# Altium integrated library BYTECH_HW_LIB_2019.IntLib: 907 symbols (part 4 of 6) (continued)
## RC0603FR0747KL (continued)
RES SMD 47K OHM 1% 1/10W 0603; MPN: RC0603FR0747KL; CompanyID: VT-00322; Solder: SMT; Value: 47K; Category: RESISTOR
footprint RESC-0603 (1608) (Resistor, Chip; 1.60 mm L X 0.80 mm W X 0.50 mm H body)
pins: 1, 2

## RC0603FR-070RL
designator R?, comment 0R
RES SMD 0.0OHM JUMPER 1/10W 0603; MPN: RC0603FR-070RL; CompanyID: VT-00901; Solder: SMT; Value: 0R; Category: RESISTOR
footprint RESC-0603 (1608) (Resistor, Chip; 1.60 mm L X 0.80 mm W X 0.50 mm H body)
pins: 1, 2

## RC0603FR-071K2L
designator R?, comment 1K2
RES SMD 1.2K OHM 1% 1/10W 0603; MPN: RC0603FR-071K2L; CompanyID: VT-01075; Solder: SMT; Value: 1K2; Category: RESISTOR
footprint RESC-0603 (1608) (Resistor, Chip; 1.60 mm L X 0.80 mm W X 0.50 mm H body)
pins: 1, 2

## RC0603FR-071K5L
designator R?, comment 1K5
RES SMD 1.5K OHM 1% 1/10W 0603; MPN: RC0603FR-071K5L; CompanyID: VT-01079; Solder: SMT; Value: 1K5; Category: RESISTOR
footprint RESC-0603 (1608) (Resistor, Chip; 1.60 mm L X 0.80 mm W X 0.50 mm H body)
pins: 1, 2

## RC0603FR-071KL
designator R?, comment 1K
RES SMD 1 KOHM 1% 1/10W 0603; MPN: RC0603FR-071KL; CompanyID: VT-00574; Solder: SMT; Value: 1K; Category: RESISTOR
footprint RESC-0603 (1608) (Resistor, Chip; 1.60 mm L X 0.80 mm W X 0.50 mm H body)
pins: 1, 2

## RC0603FR-071M5L
designator R?, comment 1.5M
RES SMD 1.5M OHM 1% 1/10W 0603; MPN: RC0603FR-071M5L; Solder: SMT; Value: 1.5M; Category: RESISTOR
footprint RESC-0603 (1608) (Resistor, Chip; 1.60 mm L X 0.80 mm W X 0.50 mm H body)
pins: 1, 2

## RC0603FR-072K7L
designator R?, comment 2K7
RES SMD 2.7K OHM 1% 1/10W 0603; MPN: RC0603FR-072K7L; MFR: Yageo; Solder: SMT; Value: 2K7; Category: RESISTOR
footprint RESC-0603 (1608) (Resistor, Chip; 1.60 mm L X 0.80 mm W X 0.50 mm H body)
pins: 1, 2

## RC0603FR-072KL
designator R?, comment 2k
RES SMD 2 KOHM 1% 1/10W 0603; MPN: RC0603FR-072KL; CompanyID: VT-00326; Solder: SMT; Value: 2k; Category: RESISTOR
footprint RESC-0603 (1608) (Resistor, Chip; 1.60 mm L X 0.80 mm W X 0.50 mm H body)
pins: 1, 2

## RC0603FR-073K3L
designator R?, comment 3K3
RES SMD 3.3K OHM 1% 1/10W 0603; MPN: RC0603FR-073K3L; Solder: SMT; CompanyID: VT-01099; Value: 3K3; Category: RESISTOR
footprint RESC-0603 (1608) (Resistor, Chip; 1.60 mm L X 0.80 mm W X 0.50 mm H body)
pins: 1, 2

## RC0603FR-073K9L
designator R?, comment 3.9K
RES SMD 3.9K OHM 1% 1/10W 0603; MPN: RC0603FR-073K9L; Solder: SMT; Value: 3.9K; Category: RESISTOR
footprint RESC-0603 (1608) (Resistor, Chip; 1.60 mm L X 0.80 mm W X 0.50 mm H body)
pins: 1, 2

## RC0603FR-074K7L
designator R?, comment 4K7
RES SMD 4.7K OHM 1% 1/10W 0603; MPN: RC0603FR-074K7L; CompanyID: VT-00327; Solder: SMT; Value: 4K7; Category: RESISTOR
footprint RESC-0603 (1608) (Resistor, Chip; 1.60 mm L X 0.80 mm W X 0.50 mm H body)
pins: 1, 2

## RC0603FR-075K6L
designator R?, comment 5K6
RES SMD 5.6K OHM 1% 1/10W 0603; MPN: RC0603FR-075K6L; CompanyID: VT-00869; Solder: SMT; Value: 5K6; Category: RESISTOR
footprint RESC-0603 (1608) (Resistor, Chip; 1.60 mm L X 0.80 mm W X 0.50 mm H body)
pins: 1, 2

## RC0603FR-075M1L
designator R?, comment 5.1M
RES SMD 5.1M OHM 1% 1/10W 0603; MPN: RC0603FR-075M1L; MFR: YAGEO; Solder: SMT; Value: 5.1M; Category: RESISTOR
footprint RESC-0603 (1608) (Resistor, Chip; 1.60 mm L X 0.80 mm W X 0.50 mm H body)
pins: 1, 2

## RC0603FR-075R1L
designator R?, comment 5.1R
RES SMD 5.1 OHM 1% 1/10W 0603; MPN: RC0603FR-075R1L; Solder: SMT; Value: 5.1R; Category: RESISTOR
footprint RESC-0603 (1608) (Resistor, Chip; 1.60 mm L X 0.80 mm W X 0.50 mm H body)
pins: 1, 2

## RC0603FR-076K8L
designator R?, comment 6K8
RES SMD 6.8K OHM 1% 1/10W 0603; MPN: RC0603FR-076K8L; CompanyID: VT-00777; Solder: SMT; Value: 6K8; Category: RESISTOR
footprint RESC-0603 (1608) (Resistor, Chip; 1.60 mm L X 0.80 mm W X 0.50 mm H body)
pins: 1, 2

## RC0603FR-077K5L
designator R?, comment 7.5K
RES SMD 7.5K OHM 1% 1/10W 0603; MPN: RC0603FR-077K5L; Solder: SMT; CompanyID: VT-01025; Value: 7.5K; Category: RESISTOR
footprint RESC-0603 (1608) (Resistor, Chip; 1.60 mm L X 0.80 mm W X 0.50 mm H body)
pins: 1, 2

## RC0603FR-077M5L
designator R?, comment 7.5M
RES SMD 7.5M OHM 1% 1/10W 0603; MPN: RC0603FR-077M5L; Solder: SMT; Value: 7.5M; Category: RESISTOR; PinCount: 2
footprint RESC-0603 (1608) (Resistor, Chip; 1.60 mm L X 0.80 mm W X 0.50 mm H body)
pins: 1, 2

## RC0603FR-078K2L
designator R?, comment 8.2K
RES SMD 8.2K OHM 1% 1/10W 0603; MPN: RC0603FR-078K2L; Solder: SMT; CompanyID: VT-01025; Value: 8.2K; Category: RESISTOR
footprint RESC-0603 (1608) (Resistor, Chip; 1.60 mm L X 0.80 mm W X 0.50 mm H body)
pins: 1, 2

## RC0603FR-0710KL
designator R?, comment 10K
RES SMD 10K OHM 1% 1/10W 0603; MPN: RC0603FR-0710KL; CompanyID: VT-00328; Solder: SMT; Value: 10K; Category: RESISTOR
footprint RESC-0603 (1608) (Resistor, Chip; 1.60 mm L X 0.80 mm W X 0.50 mm H body)
pins: 1, 2

## RC0603FR-0710ML
designator R?, comment 10M
RES SMD 10M OHM 1% 1/10W 0603; MPN: RC0603FR-0710ML; Solder: SMT; Value: 10M; Category: RESISTOR
footprint RESC-0603 (1608) (Resistor, Chip; 1.60 mm L X 0.80 mm W X 0.50 mm H body)
pins: 1, 2

## RC0603FR-0710RL
designator R?, comment 10R
RES SMD 10 OHM 1% 1/10W 0603; MPN: RC0603FR-0710RL; CompanyID: VT-00865; Solder: SMT; Value: 10R; Category: RESISTOR
footprint RESC-0603 (1608) (Resistor, Chip; 1.60 mm L X 0.80 mm W X 0.50 mm H body)
pins: 1, 2

## RC0603FR-0712KL
designator R?, comment 12K
RES SMD 12KOHM 1% 1/10W 0603; MPN: RC0603FR-0712KL; Solder: SMT; CompanyID: *; Value: 12K; Category: RESISTOR
footprint RESC-0603 (1608) (Resistor, Chip; 1.60 mm L X 0.80 mm W X 0.50 mm H body)
pins: 1, 2

## RC0603FR-0713KL
designator R?, comment 13K
RES SMD 13K OHM 1% 1/10W 0603; MPN: RC0603FR-0713KL; Solder: SMT; CompanyID: VT-01025; Value: 13K; Category: RESISTOR
footprint RESC-0603 (1608) (Resistor, Chip; 1.60 mm L X 0.80 mm W X 0.50 mm H body)
pins: 1, 2

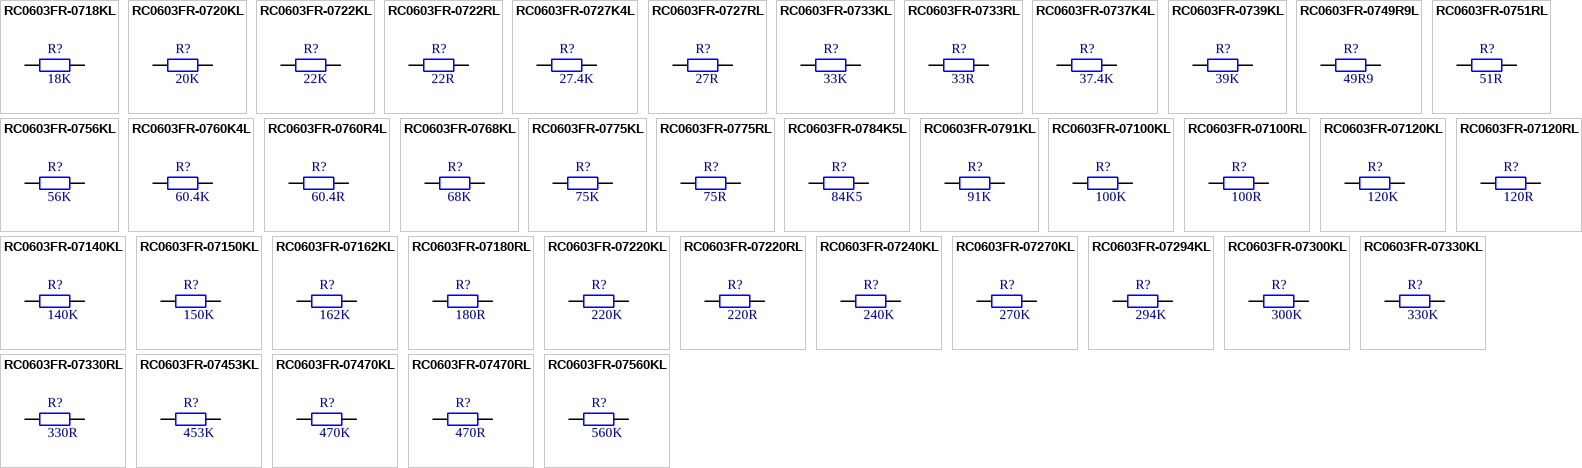
[diagram p24: symbols RC0603FR-0718KL to RC0603FR-07560KL]

## RC0603FR-0718KL
designator R?, comment 18K
RES SMD 18K OHM 1% 1/10W 0603; MPN: RC0603FR-0718KL; CompanyID: VT-00328; Solder: SMT; Value: 18K; Category: RESISTOR
footprint RESC-0603 (1608) (Resistor, Chip; 1.60 mm L X 0.80 mm W X 0.50 mm H body)
pins: 1, 2

## RC0603FR-0720KL
designator R?, comment 20K
RES SMD 20K OHM 1% 1/10W 0603; MPN: RC0603FR-0720KL; CompanyID: VT-01047; Solder: SMT; Value: 20K; Category: RESISTOR
footprint RESC-0603 (1608) (Resistor, Chip; 1.60 mm L X 0.80 mm W X 0.50 mm H body)
pins: 1, 2

## RC0603FR-0722KL
designator R?, comment 22K
RES SMD 22K OHM 1% 1/10W 0603; MPN: RC0603FR-0722KL; Solder: SMT; CompanyID: VT-00320; Value: 22K; Category: RESISTOR
footprint RESC-0603 (1608) (Resistor, Chip; 1.60 mm L X 0.80 mm W X 0.50 mm H body)
pins: 1, 2

## RC0603FR-0722RL
designator R?, comment 22R
RES SMD 22 OHM 1% 1/10W 0603; MPN: RC0603FR-0722RL; CompanyID: VT-00881; Solder: SMT; Value: 22R; Category: RESISTOR
footprint RESC-0603 (1608) (Resistor, Chip; 1.60 mm L X 0.80 mm W X 0.50 mm H body)
pins: 1, 2

## RC0603FR-0727K4L
designator R?, comment 27.4K
RES SMD 27.4K OHM 1% 1/10W 0603; MPN: RC0603FR-0727K4L; CompanyID: VT-00324; Solder: SMT; Value: 27.4K; Category: RESISTOR
footprint RESC-0603 (1608) (Resistor, Chip; 1.60 mm L X 0.80 mm W X 0.50 mm H body)
pins: 1, 2

## RC0603FR-0727RL
designator R?, comment 27R
RES SMD 27 OHM 1% 1/10W 0603; MPN: RC0603FR-0727RL; CompanyID: VT-01174; Solder: SMT; Value: 27R; Category: RESISTOR
footprint RESC-0603 (1608) (Resistor, Chip; 1.60 mm L X 0.80 mm W X 0.50 mm H body)
pins: 1, 2

## RC0603FR-0733KL
designator R?, comment 33K
RES SMD 33K OHM 1% 1/10W 0603; MPN: RC0603FR-0733KL; Solder: SMT; CompanyID: VT-01098; Value: 33K; Category: RESISTOR
footprint RESC-0603 (1608) (Resistor, Chip; 1.60 mm L X 0.80 mm W X 0.50 mm H body)
pins: 1, 2

## RC0603FR-0733RL
designator R?, comment 33R
RES SMD 33 OHM 1% 1/10W 0603; MPN: RC0603FR-0733RL; MFR: Yageo; Solder: SMT; Value: 33R; Category: RESISTOR
footprint RESC-0603 (1608) (Resistor, Chip; 1.60 mm L X 0.80 mm W X 0.50 mm H body)
pins: 1, 2

## RC0603FR-0737K4L
designator R?, comment 37.4K
RES SMD 37.4K OHM 1% 1/10W 0603; MPN: RC0603FR-0737K4L; Solder: SMT; CompanyID: VT-01024; Value: 37.4K; Category: RESISTOR
footprint RESC-0603 (1608) (Resistor, Chip; 1.60 mm L X 0.80 mm W X 0.50 mm H body)
pins: 1, 2

## RC0603FR-0739KL
designator R?, comment 39K
RES SMD 39K OHM 1% 1/10W 0603; MPN: RC0603FR-0739KL; Solder: SMT; Value: 39K; Category: RESISTOR
footprint RESC-0603 (1608) (Resistor, Chip; 1.60 mm L X 0.80 mm W X 0.50 mm H body)
pins: 1, 2

## RC0603FR-0749R9L
designator R?, comment 49R9
RES SMD 49.9 OHM 1% 1/10W 0603; MPN: RC0603FR-0749R9L; MFR: Yageo; Solder: SMT; Value: 49R9; Category: RESISTOR; PinCount: 2
footprint RESC-0603 (1608) (Resistor, Chip; 1.60 mm L X 0.80 mm W X 0.50 mm H body)
pins: 1, 2

## RC0603FR-0751RL
designator R?, comment 51R
RES SMD 51 OHM 1% 1/10W 0603; MPN: RC0603FR-0751RL; MFR: Yageo; Solder: SMT; Value: 51R; Category: RESISTOR
footprint RESC-0603 (1608) (Resistor, Chip; 1.60 mm L X 0.80 mm W X 0.50 mm H body)
pins: 1, 2

## RC0603FR-0756KL
designator R?, comment 56K
RES SMD 56K OHM 1% 1/10W 0603; MPN: RC0603FR-0756KL; CompanyID: VT-01100; Solder: SMT; Value: 56K; Category: RESISTOR
footprint RESC-0603 (1608) (Resistor, Chip; 1.60 mm L X 0.80 mm W X 0.50 mm H body)
pins: 1, 2

## RC0603FR-0760K4L
designator R?, comment 60.4K
RES SMD 60.4K OHM 1% 1/10W 0603; MPN: RC0603FR-0760K4L; CompanyID: VT-00499; Solder: SMT; Value: 60.4K; Category: RESISTOR
footprint RESC-0603 (1608) (Resistor, Chip; 1.60 mm L X 0.80 mm W X 0.50 mm H body)
pins: 1, 2

## RC0603FR-0760R4L
designator R?, comment 60.4R
RES SMD 60.4 OHM 1% 1/10W 0603; MPN: RC0603FR-0760R4L; MFR: Yageo; Solder: SMT; Value: 60.4R; Category: RESISTOR
footprint RESC-0603 (1608) (Resistor, Chip; 1.60 mm L X 0.80 mm W X 0.50 mm H body)
pins: 1, 2

## RC0603FR-0768KL
designator R?, comment 68K
RES SMD 68K OHM 1% 1/10W 0603; MPN: RC0603FR-0768KL; Solder: SMT; Value: 68K; Category: RESISTOR
footprint RESC-0603 (1608) (Resistor, Chip; 1.60 mm L X 0.80 mm W X 0.50 mm H body)
pins: 1, 2

## RC0603FR-0775KL
designator R?, comment 75K
RES SMD 75K OHM 1% 1/10W 0603; MPN: RC0603FR-0775KL; Solder: SMT; Value: 75K; Category: RESISTOR
footprint RESC-0603 (1608) (Resistor, Chip; 1.60 mm L X 0.80 mm W X 0.50 mm H body)
pins: 1, 2

## RC0603FR-0775RL
designator R?, comment 75R
RES SMD 75 OHM 1% 1/10W 0603; MPN: RC0603FR-0775RL; Solder: SMT; Value: 75R; Category: RESISTOR; PinCount: 2
footprint RESC-0603 (1608) (Resistor, Chip; 1.60 mm L X 0.80 mm W X 0.50 mm H body)
pins: 1, 2

## RC0603FR-0784K5L
designator R?, comment 84K5
RES SMD 84.5K OHM 1% 1/10W 0603; MPN: RC0603FR-0784K5L; CompanyID: VT-01315; Solder: SMT; Value: 84K5; Category: RESISTOR
footprint RESC-0603 (1608) (Resistor, Chip; 1.60 mm L X 0.80 mm W X 0.50 mm H body)
pins: 1, 2

## RC0603FR-0791KL
designator R?, comment 91K
RES SMD 91K OHM 1% 1/10W 0603; MPN: RC0603FR-0791KL; Solder: SMT; Value: 91K; Category: RESISTOR
footprint RESC-0603 (1608) (Resistor, Chip; 1.60 mm L X 0.80 mm W X 0.50 mm H body)
pins: 1, 2

## RC0603FR-07100KL
designator R?, comment 100K
RES SMD 100K OHM 1% 1/10W 0603; MPN: RC0603FR-07100KL; CompanyID: VT-00332; Solder: SMT; Value: 100K; Category: RESISTOR
footprint RESC-0603 (1608) (Resistor, Chip; 1.60 mm L X 0.80 mm W X 0.50 mm H body)
pins: 1, 2

## RC0603FR-07100RL
designator R?, comment 100R
RES SMD 100 OHM 1% 1/10W 0603; MPN: RC0603FR-07100RL; CompanyID: VT-00499; Solder: SMT; Value: 100R; Category: RESISTOR
footprint RESC-0603 (1608) (Resistor, Chip; 1.60 mm L X 0.80 mm W X 0.50 mm H body)
pins: 1, 2

## RC0603FR-07120KL
designator R?, comment 120K
RES SMD 120K OHM 1% 1/10W 0603; MPN: RC0603FR-07120KL; Solder: SMT; Value: 120K; Category: RESISTOR
footprint RESC-0603 (1608) (Resistor, Chip; 1.60 mm L X 0.80 mm W X 0.50 mm H body)
pins: 1, 2

## RC0603FR-07120RL
designator R?, comment 120R
RES SMD 120 OHM 1% 1/10W 0603; MPN: RC0603FR-07120RL; Solder: SMT; CompanyID: VT-01024; Value: 120R; Category: RESISTOR
footprint RESC-0603 (1608) (Resistor, Chip; 1.60 mm L X 0.80 mm W X 0.50 mm H body)
pins: 1, 2

## RC0603FR-07140KL
designator R?, comment 140K
RES SMD 140K OHM 1% 1/10W 0603; MPN: RC0603FR-07140KL; Solder: SMT; Value: 140K; Category: RESISTOR
footprint RESC-0603 (1608) (Resistor, Chip; 1.60 mm L X 0.80 mm W X 0.50 mm H body)
pins: 1, 2

## RC0603FR-07150KL
designator R?, comment 150K
RES SMD 150K OHM 1% 1/10W 0603; MPN: RC0603FR-07150KL; Solder: SMT; Value: 150K; Category: RESISTOR; PinCount: 2
footprint RESC-0603 (1608) (Resistor, Chip; 1.60 mm L X 0.80 mm W X 0.50 mm H body)
pins: 1, 2

## RC0603FR-07162KL
designator R?, comment 162K
RES SMD 162K OHM 1% 1/10W 0603; MPN: RC0603FR-07162KL; Solder: SMT; CompanyID: VT-01146; Value: 162K; Category: RESISTOR
footprint RESC-0603 (1608) (Resistor, Chip; 1.60 mm L X 0.80 mm W X 0.50 mm H body)
pins: 1, 2

## RC0603FR-07180RL
designator R?, comment 180R
RES SMD 180 OHM 1% 1/10W 0603; MPN: RC0603FR-07180RL; Solder: SMT; CompanyID: VT-00938; Value: 180R; Category: RESISTOR
footprint RESC-0603 (1608) (Resistor, Chip; 1.60 mm L X 0.80 mm W X 0.50 mm H body)
pins: 1, 2

## RC0603FR-07220KL
designator R?, comment 220K
RES SMD 220K OHM 1% 1/10W 0603; MPN: RC0603FR-07220KL; CompanyID: VT-00761; Solder: SMT; Value: 220K; Category: RESISTOR
footprint RESC-0603 (1608) (Resistor, Chip; 1.60 mm L X 0.80 mm W X 0.50 mm H body)
pins: 1, 2

## RC0603FR-07220RL
designator R?, comment 220R
RES SMD 220 OHM 1% 1/10W 0603; MPN: RC0603FR-07220RL; CompanyID: VT-00324; Solder: SMT; Value: 220R; Category: RESISTOR
footprint RESC-0603 (1608) (Resistor, Chip; 1.60 mm L X 0.80 mm W X 0.50 mm H body)
pins: 1, 2

## RC0603FR-07240KL
designator R?, comment 240K
RES SMD 240K OHM 1% 1/10W 0603; MPN: RC0603FR-07240KL; Solder: SMT; Value: 240K; Category: RESISTOR; PinCount: 2
footprint RESC-0603 (1608) (Resistor, Chip; 1.60 mm L X 0.80 mm W X 0.50 mm H body)
pins: 1, 2

## RC0603FR-07270KL
designator R?, comment 270K
RES SMD 270K OHM 1% 1/10W 0603; MPN: RC0603FR-07270KL; Solder: SMT; Value: 270K; Category: RESISTOR
footprint RESC-0603 (1608) (Resistor, Chip; 1.60 mm L X 0.80 mm W X 0.50 mm H body)
pins: 1, 2

## RC0603FR-07294KL
designator R?, comment 294K
RES SMD 294K OHM 1% 1/10W 0603; MPN: RC0603FR-07294KL; Solder: SMT; Value: 294K; Category: RESISTOR
footprint RESC-0603 (1608) (Resistor, Chip; 1.60 mm L X 0.80 mm W X 0.50 mm H body)
pins: 1, 2

## RC0603FR-07300KL
designator R?, comment 300K
RES SMD 300K OHM 1% 1/10W 0603; MPN: RC0603FR-07300KL; CompanyID: VT-00324; Solder: SMT; Value: 300K; Category: RESISTOR
footprint RESC-0603 (1608) (Resistor, Chip; 1.60 mm L X 0.80 mm W X 0.50 mm H body)
pins: 1, 2

## RC0603FR-07330KL
designator R?, comment 330K
RES SMD 330K OHM 1% 1/10W 0603; MPN: RC0603FR-07330KL; Solder: SMT; CompanyID: VT-01025; Value: 330K; Category: RESISTOR
footprint RESC-0603 (1608) (Resistor, Chip; 1.60 mm L X 0.80 mm W X 0.50 mm H body)
pins: 1, 2

## RC0603FR-07330RL
designator R?, comment 330R
RES SMD 330 OHM 1% 1/10W 0603; MPN: RC0603FR-07330RL; CompanyID: VT-00367; Solder: SMT; Value: 330R; Category: RESISTOR
footprint RESC-0603 (1608) (Resistor, Chip; 1.60 mm L X 0.80 mm W X 0.50 mm H body)
pins: 1, 2

## RC0603FR-07453KL
designator R?, comment 453K
RES SMD 453K OHM 1% 1/10W 0603; MPN: RC0603FR-07453KL; MFR: Yageo; Solder: SMT; Value: 453K; Category: RESISTOR; PinCount: 2
footprint RESC-0603 (1608) (Resistor, Chip; 1.60 mm L X 0.80 mm W X 0.50 mm H body)
pins: 1, 2

## RC0603FR-07470KL
designator R?, comment 470K
RES SMD 470K OHM 1% 1/10W 0603; MPN: RC0603FR-07470K; Solder: SMT; Value: 470K; Category: RESISTOR
footprint RESC-0603 (1608) (Resistor, Chip; 1.60 mm L X 0.80 mm W X 0.50 mm H body)
pins: 1, 2

## RC0603FR-07470RL
designator R?, comment 470R
RES SMD 470 OHM 1% 1/10W 0603; MPN: RC0603FR-07470RL; Solder: SMT; CompanyID: VT-01176; Value: 470R; Category: RESISTOR
footprint RESC-0603 (1608) (Resistor, Chip; 1.60 mm L X 0.80 mm W X 0.50 mm H body)
pins: 1, 2

## RC0603FR-07560KL
designator R?, comment 560K
RES SMD 560K OHM 1% 1/10W 0603; MPN: RC0603FR-07560KL; MFR: YAGEO; Solder: SMT; Value: 560K; Category: RESISTOR; PinCount: 2
footprint RESC-0603 (1608) (Resistor, Chip; 1.60 mm L X 0.80 mm W X 0.50 mm H body)
pins: 1, 2

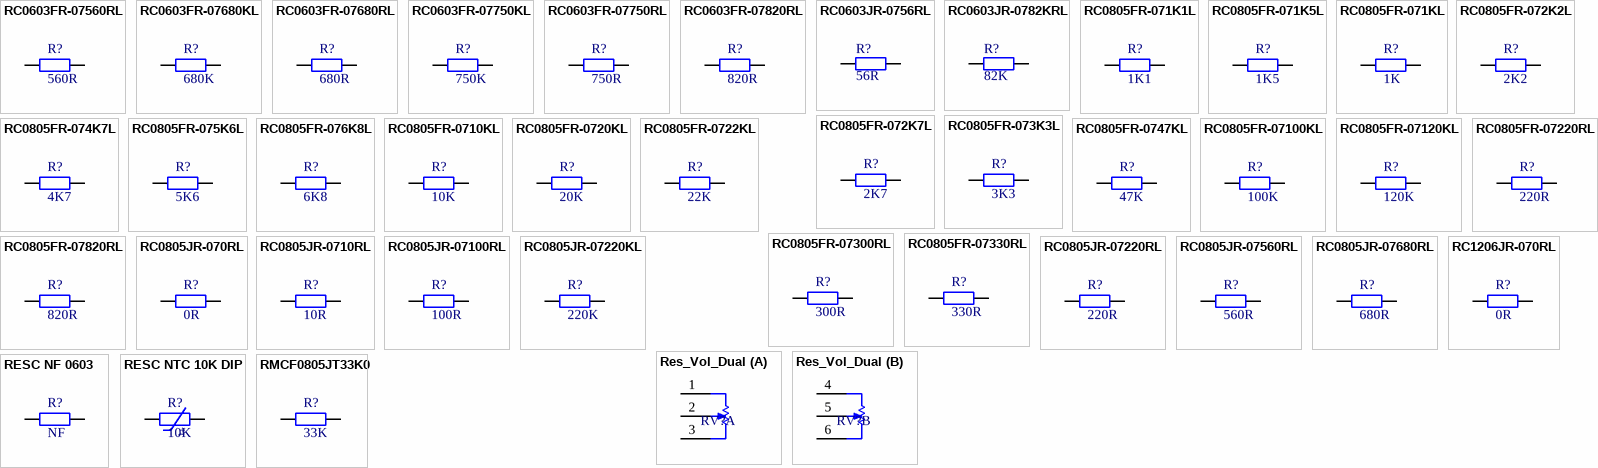
[diagram p25: symbols RC0603FR-07560RL to RMCF0805JT33K0]

## RC0603FR-07560RL
designator R?, comment 560R
RES SMD 560 OHM 1% 1/10W 0603; MPN: RC0603FR-07560RL; CompanyID: VT-00369; Solder: SMT; Value: 560R; Category: RESISTOR
footprint RESC-0603 (1608) (Resistor, Chip; 1.60 mm L X 0.80 mm W X 0.50 mm H body)
pins: 1, 2

## RC0603FR-07680KL
designator R?, comment 680K
RES SMD 680K OHM 1% 1/10W 0603; MPN: RC0603FR-07680KL; MFR: YAGEO; Solder: SMT; Value: 680K; Category: RESISTOR
footprint RESC-0603 (1608) (Resistor, Chip; 1.60 mm L X 0.80 mm W X 0.50 mm H body)
pins: 1, 2

## RC0603FR-07680RL
designator R?, comment 680R
RES SMD 680 OHM 1% 1/10W 0603; MPN: RC0603FR-07680RL; MFR: YAGEO; Solder: SMT; Value: 680R; Category: RESISTOR
footprint RESC-0603 (1608) (Resistor, Chip; 1.60 mm L X 0.80 mm W X 0.50 mm H body)
pins: 1, 2

## RC0603FR-07750KL
designator R?, comment 750K
RES SMD 750K OHM 1% 1/10W 0603; MPN: RC0603FR-07750KL; Solder: SMT; Value: 750K; Category: RESISTOR
footprint RESC-0603 (1608) (Resistor, Chip; 1.60 mm L X 0.80 mm W X 0.50 mm H body)
pins: 1, 2

## RC0603FR-07750RL
designator R?, comment 750R
RES SMD 750 OHM 1% 1/10W 0603; MPN: RC0603FR-07750RL; MFR: Yageo; Solder: SMT; Value: 750R; Category: RESISTOR
footprint RESC-0603 (1608) (Resistor, Chip; 1.60 mm L X 0.80 mm W X 0.50 mm H body)
pins: 1, 2

## RC0603FR-07820RL
designator R?, comment 820R
RES SMD 820 OHM 1% 1/10W 0603; MPN: RC0603FR-07820RL; MFR: Yageo; Solder: SMT; Value: 820R; Category: RESISTOR
footprint RESC-0603 (1608) (Resistor, Chip; 1.60 mm L X 0.80 mm W X 0.50 mm H body)
pins: 1, 2

## RC0603JR-0756RL
designator R?, comment 56R
RES SMD 56 OHM 5% 1/10W 0603; MPN: RC0603JR-0756RL; Solder: SMT; Value: 56R; Category: RESISTOR
footprint RESC-0603 (1608) (Resistor, Chip; 1.60 mm L X 0.80 mm W X 0.50 mm H body)
pins: 1, 2

## RC0603JR-0782KRL
designator R?, comment 82K
RES SMD 82K OHM 5% 1/10W 0603; MPN: RC0603JR-0782KRL; Solder: SMT; Value: 82K; Category: RESISTOR
footprint RESC-0603 (1608) (Resistor, Chip; 1.60 mm L X 0.80 mm W X 0.50 mm H body)
pins: 1, 2

## RC0805FR-071K1L
designator R?, comment 1K1
RES SMD 1.1K OHM 1% 1/8W 0805; MPN: RC0805FR-071K1L; Solder: SMT; CompanyID: VT-00993; Value: 1K1; Category: RESISTOR
footprint RESC-0805 (2012) (Resistor, Chip; 2.00 mm L X 1.25 mm W X 0.70 mm H body)
pins: 1, 2

## RC0805FR-071K5L
designator R?, comment 1K5
RES SMD 1.5K OHM 1% 1/10W 0805; MPN: RC0805FR-071K5L; CompanyID: VT-00312; Solder: SMT; Value: 1K5; Category: RESISTOR
footprint RESC-0805 (2012) (Resistor, Chip; 2.00 mm L X 1.25 mm W X 0.70 mm H body)
pins: 1, 2

## RC0805FR-071KL
designator R?, comment 1K
RES SMD 1K OHM 1% 1/8W 0805; MPN: RC0805FR-071KL; Solder: SMT; CompanyID: VT-00024; Value: 1K; Category: RESISTOR
footprint RESC-0805 (2012) (Resistor, Chip; 2.00 mm L X 1.25 mm W X 0.70 mm H body)
pins: 1, 2

## RC0805FR-072K2L
designator R?, comment 2K2
RES SMD 2.2K OHM 1% 1/8W 0805; MPN: RC0805FR-072K2L; CompanyID: VT-00004; Solder: SMT; Value: 2K2; Category: RESISTOR
footprint RESC-0805 (2012) (Resistor, Chip; 2.00 mm L X 1.25 mm W X 0.70 mm H body)
pins: 1, 2

## RC0805FR-072K7L
designator R?, comment 2K7
RES SMD 2K7 OHM 1% 1/8W 0805; MPN: RC0805FR-072K7L; MFR: Yageo; Solder: SMT; Value: 2K7; Category: RESISTOR
footprint RESC-0805 (2012) (Resistor, Chip; 2.00 mm L X 1.25 mm W X 0.70 mm H body)
pins: 1, 2

## RC0805FR-073K3L
designator R?, comment 3K3
RES SMD 3.3K OHM 1% 1/8W 0805; MPN: RC0805FR-073K3L; CompanyID: VT-00010; Solder: SMT; Value: 3K3; Category: RESISTOR
footprint RESC-0805 (2012) (Resistor, Chip; 2.00 mm L X 1.25 mm W X 0.70 mm H body)
pins: 1, 2

## RC0805FR-074K7L
designator R?, comment 4K7
RES SMD 4.7K OHM 1% 1/8W 0805; MPN: RC0805FR-074K7L; Solder: SMT; CompanyID: VT-00155; Value: 4K7; Category: RESISTOR
footprint RESC-0805 (2012) (Resistor, Chip; 2.00 mm L X 1.25 mm W X 0.70 mm H body)
pins: 1, 2

## RC0805FR-075K6L
designator R?, comment 5K6
RES SMD 5.6K OHM 1% 1/8W 0805; MPN: RC0805FR-075K6L; CompanyID: VT-00008; Solder: SMT; Value: 5K6; Category: RESISTOR
footprint RESC-0805 (2012) (Resistor, Chip; 2.00 mm L X 1.25 mm W X 0.70 mm H body)
pins: 1, 2

## RC0805FR-076K8L
designator R?, comment 6K8
RES SMD 6.8K OHM 1% 1/8W 0805; MPN: RC0805FR-076K8L; Solder: SMT; CompanyID: VT-00193; Value: 6K8; Category: RESISTOR
footprint RESC-0805 (2012) (Resistor, Chip; 2.00 mm L X 1.25 mm W X 0.70 mm H body)
pins: 1, 2

## RC0805FR-0710KL
designator R?, comment 10K
RES SMD 10K OHM 1% 1/8W 0805; MPN: RC0805FR-0710KL; CompanyID: VT-00007; Solder: SMT; Value: 10K; Category: RESISTOR
footprint RESC-0805 (2012) (Resistor, Chip; 2.00 mm L X 1.25 mm W X 0.70 mm H body)
pins: 1, 2

## RC0805FR-0720KL
designator R?, comment 20K
RES SMD 20K OHM 1% 1/8W 0805; MPN: RC0805FR-0720KL; CompanyID: VT-00005; Solder: SMT; Value: 20K; Category: RESISTOR
footprint RESC-0805 (2012) (Resistor, Chip; 2.00 mm L X 1.25 mm W X 0.70 mm H body)
pins: 1, 2

## RC0805FR-0722KL
designator R?, comment 22K
RES SMD 22K OHM 1% 1/8W 0805; MPN: RC0805FR-0722KL; Solder: SMT; CompanyID: VT-00345; Value: 22K; Category: RESISTOR
footprint RESC-0805 (2012) (Resistor, Chip; 2.00 mm L X 1.25 mm W X 0.70 mm H body)
pins: 1, 2

## RC0805FR-0747KL
designator R?, comment 47K
RES SMD 47K OHM 1% 1/8W 0805; MPN: RC0805FR-0747KL; CompanyID: VT-00041; Solder: SMT; Value: 47K; Category: RESISTOR
footprint RESC-0805 (2012) (Resistor, Chip; 2.00 mm L X 1.25 mm W X 0.70 mm H body)
pins: 1, 2

## RC0805FR-07100KL
designator R?, comment 100K
RES SMD 100K OHM 1% 1/8W 0805; MPN: RC0805FR-07100KL; Solder: SMT; CompanyID: VT-00006; Value: 100K; Category: RESISTOR
footprint RESC-0805 (2012) (Resistor, Chip; 2.00 mm L X 1.25 mm W X 0.70 mm H body)
pins: 1, 2

## RC0805FR-07120KL
designator R?, comment 120K
RES SMD 120K OHM 1% 1/8W 0805; MPN: RC0805FR-07120KL; Solder: SMT; CompanyID: VT-00509; Value: 120K; Category: RESISTOR
footprint RESC-0805 (2012) (Resistor, Chip; 2.00 mm L X 1.25 mm W X 0.70 mm H body)
pins: 1, 2

## RC0805FR-07220RL
designator R?, comment 220R
RES SMD 220 OHM 1% 1/8W 0805; MPN: RC0805FR-07220RL; CompanyID: VT-00003; Solder: SMT; Value: 220R; Category: RESISTOR
footprint RESC-0805 (2012) (Resistor, Chip; 2.00 mm L X 1.25 mm W X 0.70 mm H body)
pins: 1, 2

## RC0805FR-07300RL
designator R?, comment 300R
RES SMD 300 OHM 1% 1/8W 0805; MPN: RC0805FR-07300RL; Solder: SMT; CompanyID: VT-00929; Value: 300R; Category: RESISTOR
footprint RESC-0805 (2012) (Resistor, Chip; 2.00 mm L X 1.25 mm W X 0.70 mm H body)
pins: 1, 2

## RC0805FR-07330RL
designator R?, comment 330R
RES SMD 330 OHM 1% 1/8W 0805; MPN: RC0805FR-07330RL; CompanyID: VT-00009; Solder: SMT; Value: 330R; Category: RESISTOR
footprint RESC-0805 (2012) (Resistor, Chip; 2.00 mm L X 1.25 mm W X 0.70 mm H body)
pins: 1, 2

## RC0805FR-07820RL
designator R?, comment 820R
RES SMD 820 OHM 1% 1/8W 0805; MPN: RC0805FR-07820RL; CompanyID: VT-00310; Solder: SMT; Value: 820R; Category: RESISTOR
footprint RESC-0805 (2012) (Resistor, Chip; 2.00 mm L X 1.25 mm W X 0.70 mm H body)
pins: 1, 2

## RC0805JR-070RL
designator R?, comment 0R
RES SMD 0.0 OHM JUMPER 1/8W 0805; MPN: RC0805JR-070RL; Solder: SMT; CompanyID: VT-00002; Value: 0R; Category: RESISTOR
footprint RESC-0805 (2012) (Resistor, Chip; 2.00 mm L X 1.25 mm W X 0.70 mm H body)
pins: 1, 2

## RC0805JR-0710RL
designator R?, comment 10R
RES SMD 10 OHM 5% 1/8W 0805; MPN: RC0805JR-0710RL; CompanyID: VT-00311; Solder: SMT; Value: 10R; Category: RESISTOR
footprint RESC-0805 (2012) (Resistor, Chip; 2.00 mm L X 1.25 mm W X 0.70 mm H body)
pins: 1, 2

## RC0805JR-07100RL
designator R?, comment 100R
RES SMD 100 OHM 5% 1/8W 0805; MPN: RC0805JR-07100RL; Solder: SMT; CompanyID: VT-00001; Value: 100R; Category: RESISTOR
footprint RESC-0805 (2012) (Resistor, Chip; 2.00 mm L X 1.25 mm W X 0.70 mm H body)
pins: 1, 2

## RC0805JR-07220KL
designator R?, comment 220K
RES SMD 220K OHM 5% 1/8W 0805; MPN: RC0805JR-07220KL; Solder: SMT; CompanyID: VT-00641; Value: 220K; Category: RESISTOR
footprint RESC-0805 (2012) (Resistor, Chip; 2.00 mm L X 1.25 mm W X 0.70 mm H body)
pins: 1, 2

## RC0805JR-07220RL
designator R?, comment 220R
RES SMD 220 OHM 5% 1/8W 0805; MPN: RC0805JR-07220RL; Solder: SMT; CompanyID: VT-01295; Value: 220R; Category: RESISTOR
footprint RESC-0805 (2012) (Resistor, Chip; 2.00 mm L X 1.25 mm W X 0.70 mm H body)
pins: 1, 2

## RC0805JR-07560RL
designator R?, comment 560R
RES SMD 560 OHM 5% 1/8W 0805; MPN: RC0805JR-07560RL; Solder: SMT; CompanyID: VT-00199; Value: 560R; Category: RESISTOR
footprint RESC-0805 (2012) (Resistor, Chip; 2.00 mm L X 1.25 mm W X 0.70 mm H body)
pins: 1, 2

## RC0805JR-07680RL
designator R?, comment 680R
RES SMD 680 OHM 5% 1/8W 0805; MPN: RC0805JR-07680RL; Solder: SMT; CompanyID: VT-00919; Value: 680R; Category: RESISTOR
footprint RESC-0805 (2012) (Resistor, Chip; 2.00 mm L X 1.25 mm W X 0.70 mm H body)
pins: 1, 2

## RC1206JR-070RL
designator R?, comment 0R
RES SMD 0.0 OHM JUMPER 1/4W 1206; MPN: RC1206JR-070RL; CompanyID: VT-01082; Solder: SMT; Value: 0R; Category: RESISTOR
footprint RESC-1206 (3216) (Resistor, Chip; 3.10 mm L X 1.60 mm W X 0.90 mm H body)
pins: 1, 2

## Res_Vol_Dual
designator RV?, comment RV20K  (value not drawn)
Volume Varistor Single; Category: RESISTOR
footprint RES_VOL_VARISTOR (DOUBLE,SHORT COIL)
part A pins: 1, 2, 3
part B pins: 4, 5, 6

## RESC NF 0603
designator R?, comment NF
RES SMD, Not Fill, 0603; Solder: Not Fill; Value: NF; Category: RESISTOR
footprint RESC-0603 (1608) (Resistor, Chip; 1.60 mm L X 0.80 mm W X 0.50 mm H body)
pins: 1, 2

## RESC NTC 10K DIP
designator R?, comment 10K
THERMISTOR NTC 10KOHM 3964K BEAD; MPN: 01M1002JF; MFR: Vishay Dale; Solder: Wave; Value: 10K; Category: RESISTOR
footprint RES NTC 10K
pins: 1, 2
text: +t

## RMCF0805JT33K0
designator R?, comment 33K
RES SMD 33K OHM 5% 1/8W 0805; MPN: RMCF0805JT33K0; Solder: SMT; CompanyID: VT-00156; Value: 33K; Category: RESISTOR
footprint RESC-0805 (2012) (Resistor, Chip; 2.00 mm L X 1.25 mm W X 0.70 mm H body)
pins: 1, 2

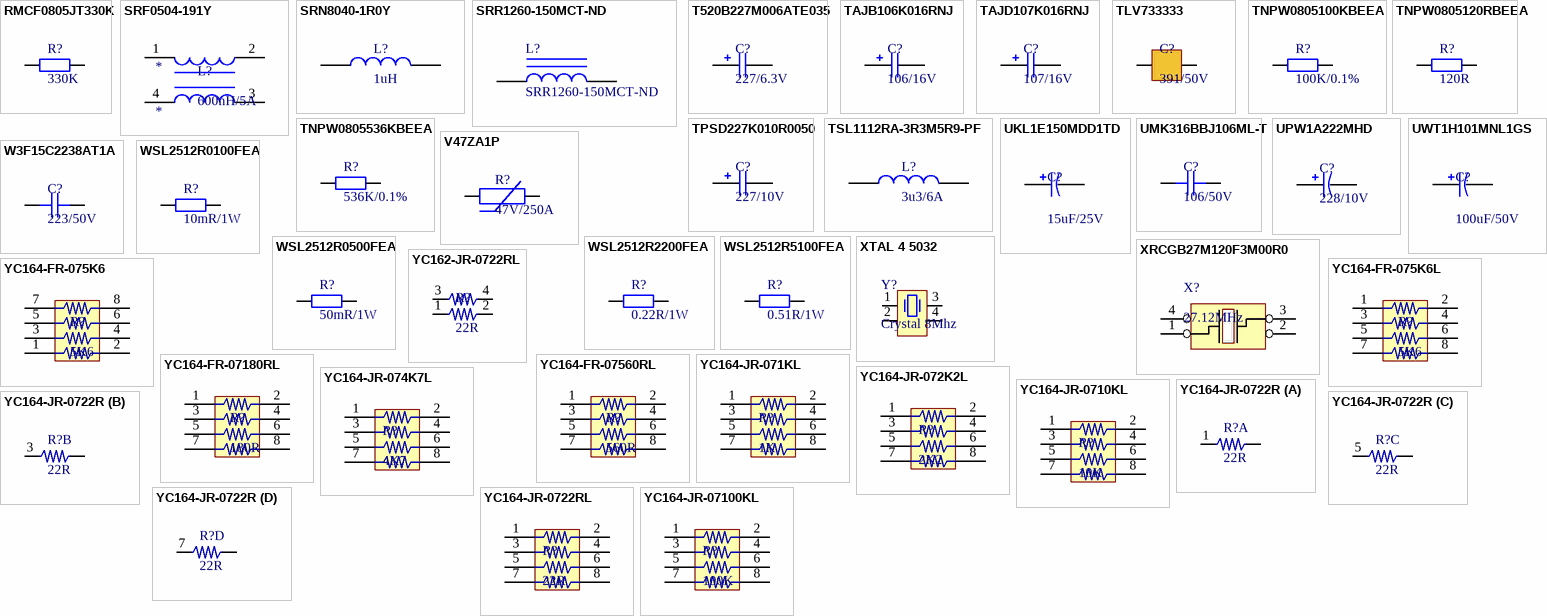
[diagram p26: symbols RMCF0805JT330K to YC164-JR-07100KL]

## RMCF0805JT330K
designator R?, comment 330K
RES SMD 330K OHM 5% 1/8W 0805; MPN: RMCF0805JT330K; CompanyID: VT-00277; Solder: SMT; Value: 330K; Category: RESISTOR
footprint RESC-0805 (2012) (Resistor, Chip; 2.00 mm L X 1.25 mm W X 0.70 mm H body)
pins: 1, 2

## SRF0504-191Y
designator L?, comment 600nH/5A
IND-CMC 600nH 5A 2LN 190 OHM SMD; MPN: SRF0504-191Y; Solder: SMT; CompanyID: VT-00882; Value: 600nH/5A; Category: INDUCTOR
footprint INDUCTOR-SRF0504-4.8X5MM (Common Mode Choke)
pins: 1, 2, 3, 4

## SRN8040-1R0Y
designator L?, comment 1uH
FIXED IND 1UH 7.8A 10 MOHM SMD; MPN: SRN8040-1R0Y; MFR: Bourns Inc.; Solder: SMT; Value: 1uH; Category: INDUCTOR; PinCount: 2
footprint IND-SRN8040
pins: 1, 2

## SRR1260-150MCT-ND
designator L?
INDUCTOR POWER 15UH 5.0A SMD; MFR: Bourns Inc.; MPN: SRR1260-150M; Category: INDUCTOR
footprint IND-DR127-330-R-12.5x12.5MM
pins: 1, 2

## T520B227M006ATE035
designator C?, comment 227/6.3V
CAP TANT POLY 220uF 20% 6.3V 3528 35mOhm ESR; MPN: T520B227M006ATE035; Solder: SMT; CompanyID: VT-00643; Value: 227/6.3V; Category: CAPACITOR; PinCount: 2
footprint CAP_TANTAL_1210(3528) (Chip Resistor, Body 5.0x2.5mm, IPC High Density)
pins: 1, 2

## TAJB106K016RNJ
designator C?, comment 106/16V
CAP TANT 10uF 16V 10% 1411 (3258); MPN: TAJB106K016RNJ; CompanyID: VT-01089; Solder: SMT; Value: 106/16V; Category: CAPACITOR; PinCount: 2
footprint CAP_TANTAL_1210(3528) (Chip Resistor, Body 5.0x2.5mm, IPC High Density)
pins: 1, 2

## TAJD107K016RNJ
designator C?, comment 107/16V
CAP TANT 100uF 16V 10% 2917; MPN: TAJD107K016RNJ; Solder: SMT; CompanyID: VT-00022; Value: 107/16V; Category: CAPACITOR; PinCount: 2
footprint CAP_TANTAL_2917(7343-31) (Chip Resistor, Body 6.0x3.2mm, IPC High Density)
pins: 1, 2

## TLV733333
designator C?, comment 391/50V
CAP CER 390PF 50V NP0 0805; MPN: 08055A391FAT2A; CompanyID: VT-01334; Solder: SMT; Value: 391/50V; Category: CAPACITOR; PinCount: 2
footprint CAPC-0805 (2012) (Resistor, Chip; 2.00 mm L X 1.25 mm W X 0.70 mm H body)
pins: 1, 2

## TNPW0805100KBEEA
designator R?, comment 100K/0.1%
RES SMD 100K OHM 0.1% 1/8W 0805; MPN: TNPW0805100KBEEA; Solder: SMT; CompanyID: VT-00770; Value: 100K/0.1%; Category: RESISTOR
footprint RESC-0805 (2012) (Resistor, Chip; 2.00 mm L X 1.25 mm W X 0.70 mm H body)
pins: 1, 2

## TNPW0805120RBEEA
designator R?, comment 120R
RES SMD 120 OHM 0.1% 1/8W 0805; MPN: TNPW0805120RBEEA; CompanyID: VT-00769; Solder: SMT; Value: 120R; Category: RESISTOR
footprint RESC-0805 (2012) (Resistor, Chip; 2.00 mm L X 1.25 mm W X 0.70 mm H body)
pins: 1, 2

## TNPW0805536KBEEA
designator R?, comment 536K/0.1%
RES SMD 536K OHM 0.1% 1/8W 0805; MPN: TNPW0805536KBEEA; CompanyID: VT-00642; Solder: SMT; Value: 536K/0.1%; Category: RESISTOR
footprint RESC-0805 (2012) (Resistor, Chip; 2.00 mm L X 1.25 mm W X 0.70 mm H body)
pins: 1, 2

## TPSD227K010R0050
designator C?, comment 227/10V
CAP TANT 220uF 10V 10% 2917 45mOhm ESR; MPN: TPSD227K010R0050; CompanyID: VT-00021; Solder: SMT; Value: 227/10V; Category: CAPACITOR; PinCount: 2
footprint CAP_TANTAL_2917(7343-31) (Chip Resistor, Body 6.0x3.2mm, IPC High Density)
pins: 1, 2

## TSL1112RA-3R3M5R9-PF
designator L?, comment 3u3/6A
FIXED IND 3.3uH 5.9A 10mOhm TH; MPN: TSL1112RA-3R3M5R9-PF; CompanyID: VT-00530; Solder: WAVE; Value: 3u3/6A; Category: INDUCTOR
footprint INDUCTOR-TSL1112-TH (Inductor, Radial (Inductor); 5.00 mm C X 11.20 mm Dia X 12.20 mm H body)
pins: 1, 2

## UKL1E150MDD1TD
designator C?, comment 15uF/25V
CAP ALUM 15UF 20% 25V RADIAL; MPN: UKL1E150MDD1TD; MFR: Nichicon; Solder: WAVE; Value: 15uF/25V; Category: CAPACITOR; PinCount: 2
footprint CAP_ALUM_D050_S20_H110
pins: 1, 2
1 alternate drawing of the same symbol